# Altium footprint library pcb.PcbLib: 22 footprints (part 2 of 2)
Each footprint in its own frame and in the unit in brackets; x right, y up, seen from the top. Pads: shape width x height; smd on the part's side, far side on the other; paste and mask are expansions set on the pad; w line width, h text height; cw(c..) or ccw(c..) is an arc to the next point about the centre after c.
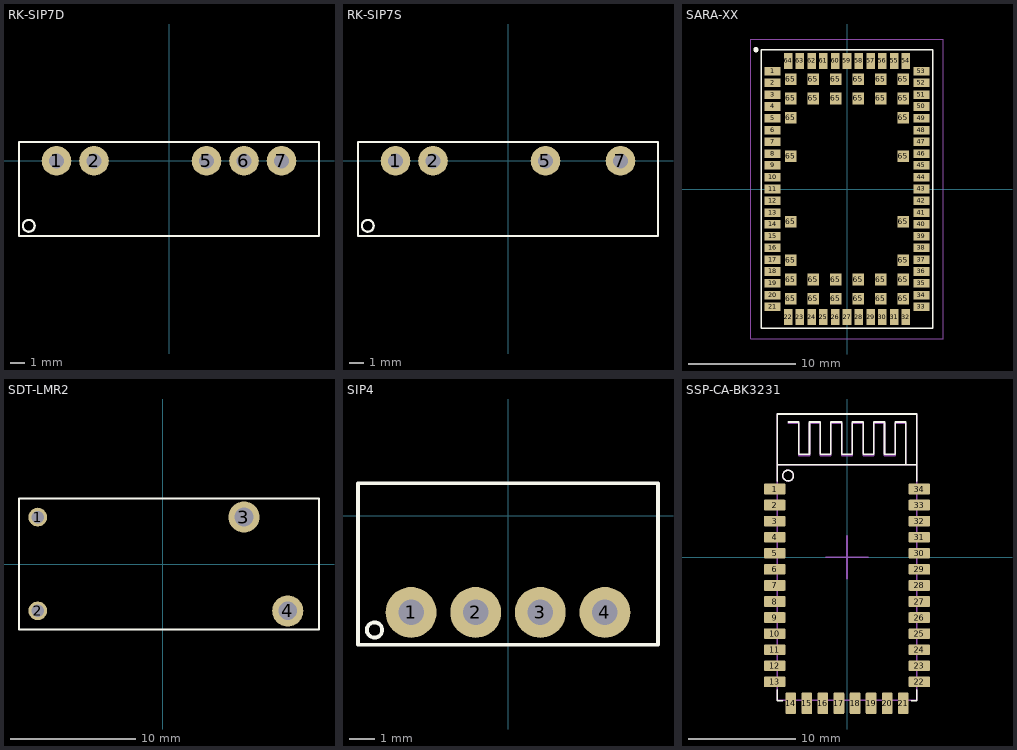
[diagram p1: the footprints below, top view; thin cyan lines are the x and y axes]

## RK-SIP7D [mm]
height 10.2
pads (5):
  round 2 hole 1: 1(-7.62,0) 2(-5.08,0) 5(2.54,0) 6(5.08,0) 7(7.62,0)
Top Overlay:
  circle w0.15: c-9.5,-4.4 r0.4
  lines w0.15: -10.16,-5.08 10.16,-5.08 10.16,1.27 -10.16,1.27 -10.16,-5.08
3D body: height 10.2, standoff 0, extent -10.159,-5.079 10.159,1.269

## RK-SIP7S [mm]
height 10.2
pads (4):
  round 2 hole 1: 1(-7.62,0) 2(-5.08,0) 5(2.54,0) 7(7.62,0)
Top Overlay:
  circle w0.15: c-9.5,-4.4 r0.4
  lines w0.15: -10.16,-5.08 10.16,-5.08 10.16,1.27 -10.16,1.27 -10.16,-5.08
3D body: height 10.2, standoff 0, extent -10.159,-5.079 10.159,1.269

## SARA-XX [mm] "GSM/GPRS and GSM/EGPRS/HSPA Cellular Module"
height 3.25
pads (96):
  rect 1.5x0.8 smd paste-1: 1(-6.95,11) 2(-6.95,9.9) 3(-6.95,8.8) 4(-6.95,7.7) 5(-6.95,6.6) 6(-6.95,5.5) 7(-6.95,4.4) 8(-6.95,3.3) 9(-6.95,2.2) 10(-6.95,1.1) 11(-6.95,0) 12(-6.95,-1.1) 13(-6.95,-2.2) 14(-6.95,-3.3) 15(-6.95,-4.4) 16(-6.95,-5.5) 17(-6.95,-6.6) 18(-6.95,-7.7) 19(-6.95,-8.8) 20(-6.95,-9.9) 21(-6.95,-11) 33(6.95,-11) 34(6.95,-9.9) 35(6.95,-8.8) 36(6.95,-7.7) 37(6.95,-6.6) 38(6.95,-5.5) 39(6.95,-4.4) 40(6.95,-3.3) 41(6.95,-2.2) 42(6.95,-1.1) 43(6.95,0) 44(6.95,1.1) 45(6.95,2.2) 46(6.95,3.3) 47(6.95,4.4) 48(6.95,5.5) 49(6.95,6.6) 50(6.95,7.7) 51(6.95,8.8) 52(6.95,9.9) 53(6.95,11)
  rect 0.8x1.5 smd paste-1: 22(-5.5,-11.95) 23(-4.4,-11.95) 24(-3.3,-11.95) 25(-2.2,-11.95) 26(-1.1,-11.95) 27(0,-11.95) 28(1.1,-11.95) 29(2.2,-11.95) 30(3.3,-11.95) 31(4.4,-11.95) 32(5.5,-11.95) 54(5.5,11.95) 55(4.4,11.95) 56(3.3,11.95) 57(2.2,11.95) 58(1.1,11.95) 59(0,11.95) 60(-1.1,11.95) 61(-2.2,11.95) 62(-3.3,11.95) 63(-4.4,11.95) 64(-5.5,11.95)
  rect 1.1x1.1 smd paste-0.025: 65(-5.25,-10.25) 65(-5.25,-8.45) 65(-5.25,-6.65) 65(-5.25,-3.05) 65(-5.25,3.05) 65(-5.25,6.65) 65(-5.25,8.45) 65(-5.25,10.25) 65(-3.15,-10.25) 65(-3.15,-8.45) 65(-3.15,8.45) 65(-3.15,10.25) 65(-1.05,-10.25) 65(-1.05,-8.45) 65(-1.05,8.45) 65(-1.05,10.25) 65(1.05,-10.25) 65(1.05,-8.45) 65(1.05,8.45) 65(1.05,10.25) 65(3.15,-10.25) 65(3.15,-8.45) 65(3.15,8.45) 65(3.15,10.25) 65(5.25,-10.25) 65(5.25,-8.45) 65(5.25,-6.65) 65(5.25,-3.05) 65(5.25,3.05) 65(5.25,6.65) 65(5.25,8.45) 65(5.25,10.25)
Top Overlay:
  circle w0.4: c-8.5,13 r0.05
  lines w0.15: -8,-13 8,-13 8,13 -8,13 -8,-13
Top Paste:
  rectangle: -7.775,10.625 -6.225,11.375
  rectangle: -7.775,9.525 -6.225,10.275
  rectangle: -7.775,8.425 -6.225,9.175
  rectangle: -7.775,7.325 -6.225,8.075
  rectangle: -7.775,6.225 -6.225,6.975
  rectangle: -7.775,5.125 -6.225,5.875
  rectangle: -7.775,4.025 -6.225,4.775
  rectangle: -7.775,2.925 -6.225,3.675
  rectangle: -7.775,1.825 -6.225,2.575
  rectangle: -7.775,0.725 -6.225,1.475
  rectangle: -7.775,-0.375 -6.225,0.375
  rectangle: -7.775,-1.475 -6.225,-0.725
  rectangle: -7.775,-2.575 -6.225,-1.825
  rectangle: -7.775,-3.675 -6.225,-2.925
  rectangle: -7.775,-4.775 -6.225,-4.025
  rectangle: -7.775,-5.875 -6.225,-5.125
  rectangle: -7.775,-6.975 -6.225,-6.225
  rectangle: -7.775,-8.075 -6.225,-7.325
  rectangle: -7.775,-9.175 -6.225,-8.425
  rectangle: -7.775,-10.275 -6.225,-9.525
  rectangle: -7.775,-11.375 -6.225,-10.625
  region: -5.125,-12.775 -5.125,-11.225 -5.875,-11.225 -5.875,-12.775
  region: -4.025,-12.775 -4.025,-11.225 -4.775,-11.225 -4.775,-12.775
  region: -2.925,-12.775 -2.925,-11.225 -3.675,-11.225 -3.675,-12.775
  region: -1.825,-12.775 -1.825,-11.225 -2.575,-11.225 -2.575,-12.775
  region: -0.725,-12.775 -0.725,-11.225 -1.475,-11.225 -1.475,-12.775
  region: 0.375,-12.775 0.375,-11.225 -0.375,-11.225 -0.375,-12.775
  region: 1.475,-12.775 1.475,-11.225 0.725,-11.225 0.725,-12.775
  region: 2.575,-12.775 2.575,-11.225 1.825,-11.225 1.825,-12.775
  region: 3.675,-12.775 3.675,-11.225 2.925,-11.225 2.925,-12.775
  region: 4.775,-12.775 4.775,-11.225 4.025,-11.225 4.025,-12.775
  region: 5.875,-12.775 5.875,-11.225 5.125,-11.225 5.125,-12.775
  rectangle: 6.225,-11.375 7.775,-10.625
  rectangle: 6.225,-10.275 7.775,-9.525
  rectangle: 6.225,-9.175 7.775,-8.425
  rectangle: 6.225,-8.075 7.775,-7.325
  rectangle: 6.225,-6.975 7.775,-6.225
  rectangle: 6.225,-5.875 7.775,-5.125
  rectangle: 6.225,-4.775 7.775,-4.025
  rectangle: 6.225,-3.675 7.775,-2.925
  rectangle: 6.225,-2.575 7.775,-1.825
  rectangle: 6.225,-1.475 7.775,-0.725
  rectangle: 6.225,-0.375 7.775,0.375
  rectangle: 6.225,0.725 7.775,1.475
  rectangle: 6.225,1.825 7.775,2.575
  rectangle: 6.225,2.925 7.775,3.675
  rectangle: 6.225,4.025 7.775,4.775
  rectangle: 6.225,5.125 7.775,5.875
  rectangle: 6.225,6.225 7.775,6.975
  rectangle: 6.225,7.325 7.775,8.075
  rectangle: 6.225,8.425 7.775,9.175
  rectangle: 6.225,9.525 7.775,10.275
  rectangle: 6.225,10.625 7.775,11.375
  region: 4.775,11.225 4.775,12.775 4.025,12.775 4.025,11.225
  region: 3.675,11.225 3.675,12.775 2.925,12.775 2.925,11.225
  region: 2.575,11.225 2.575,12.775 1.825,12.775 1.825,11.225
  region: 5.875,11.225 5.875,12.775 5.125,12.775 5.125,11.225
  region: 1.475,11.225 1.475,12.775 0.725,12.775 0.725,11.225
  region: 0.375,11.225 0.375,12.775 -0.375,12.775 -0.375,11.225
  region: -0.725,11.225 -0.725,12.775 -1.475,12.775 -1.475,11.225
  region: -1.825,11.225 -1.825,12.775 -2.575,12.775 -2.575,11.225
  region: -2.925,11.225 -2.925,12.775 -3.675,12.775 -3.675,11.225
  region: -4.025,11.225 -4.025,12.775 -4.775,12.775 -4.775,11.225
  region: -5.125,11.225 -5.125,12.775 -5.875,12.775 -5.875,11.225
Mechanical 15:
  lines w0.05: -9,-14 9,-14 9,14 -9,14 -9,-14
3D body "SARA.STEP": height 3, standoff 0, extent -8,-13 8,13
3D body "SARA.STEP": height 0.13, standoff -2.87, extent -8,-13.05 8,12.95

## SDT-LMR2 [mm]
height 25
pads (4):
  round 1.5 hole 1: 1(-10,3.75) 2(-10,-3.75)
  round 2.5 hole 1.5: 3(6.5,3.75) 4(10,-3.75)
Top Overlay:
  lines w0.15: -11.5,-5.25 -11.5,5.25 12.5,5.25 12.5,-5.25 -11.5,-5.25
3D body: height 25, standoff 0.5, extent -11.499,-5.249 12.499,5.249

## SIP4 [mm]
height 10.2
pads (4):
  round 2 hole 1: 1(-3.81,-3.81) 2(-1.27,-3.81) 3(1.27,-3.81) 4(3.81,-3.81)
Top Overlay:
  circle w0.15: c-5.25,-4.5 r0.3
  lines w0.15: -5.9,-5.08 -5.9,1.27 5.9,1.27 5.9,-5.08 -5.9,-5.08
3D body: height 10.2, standoff 0, extent -5.8,-4.9 5.8,1.1

## SSP-CA-BK3231 [mm]
height 2
pads (34):
  rrect20% 2x1 smd: 1(-6.75,6.375) 2(-6.75,4.875) 3(-6.75,3.375) 4(-6.75,1.875) 5(-6.75,0.375) 6(-6.75,-1.125) 7(-6.75,-2.625) 8(-6.75,-4.125) 9(-6.75,-5.625) 10(-6.75,-7.125) 11(-6.75,-8.625) 12(-6.75,-10.125) 13(-6.75,-11.625) 22(6.75,-11.625) 23(6.75,-10.125) 24(6.75,-8.625) 25(6.75,-7.125) 26(6.75,-5.625) 27(6.75,-4.125) 28(6.75,-2.625) 29(6.75,-1.125) 30(6.75,0.375) 31(6.75,1.875) 32(6.75,3.375) 33(6.75,4.875) 34(6.75,6.375)
  rrect20% 1x2 smd: 14(-5.25,-13.625) 15(-3.75,-13.625) 16(-2.25,-13.625) 17(-0.75,-13.625) 18(0.75,-13.625) 19(2.25,-13.625) 20(3.75,-13.625) 21(5.25,-13.625)
Top Overlay:
  circle w0.15: c-5.5,7.625 r0.5
  lines w0.15: -6.5,-12.375 -6.5,-13.375 -6,-13.375 ; -6.5,7.125 -6.5,13.375 6.5,13.375 6.5,7.125 ; -6.5,8.625 6.5,8.625 ; -5.5,12.625 -4.5,12.625 -4.5,9.625 -3.5,9.625 -3.5,12.625 -2.5,12.625 -2.5,9.625 -1.5,9.625 -1.5,12.625 -0.5,12.625 -0.5,9.625 0.5,9.625 0.5,12.625 1.5,12.625 1.5,9.625 2.5,9.625 2.5,12.625 3.5,12.625 3.5,9.625 4.5,9.625 4.5,12.625 5.5,12.625 5.5,8.625 ; 6,-13.375 6.5,-13.375 6.5,-12.375
Mechanical 15:
  lines w0.15: -2,0 0,0 2,0 ; 0,-2 0,2
Top Assembly:
  circle w0.15: c-5.5,7.625 r0.5
  lines w0.15: -6.5,8.65 6.5,8.65 ; -5.5,12.5 -4.5,12.5 -4.5,9.5 -3.5,9.5 -3.5,12.5 -2.5,12.5 -2.5,9.5 -1.5,9.5 -1.5,12.5 -0.5,12.5 -0.5,9.5 0.5,9.5 0.5,12.5 1.5,12.5 1.5,9.5 2.5,9.5 2.5,12.5 3.5,12.5 3.5,9.5 4.5,9.5 4.5,12.5 5.5,12.5 5.5,8.65 ; -6.5,-13.35 -6.5,13.375 6.5,13.375 6.5,-13.35 -6.5,-13.35
  text ".Designator" at -4,-1.3 h1